# Altium footprint library ParsaLibrary.PcbLib: 526 footprints (part 33 of 33)
Each footprint in its own frame and in the unit in brackets; x right, y up, seen from the top. Pads: shape width x height; smd on the part's side, far side on the other; paste and mask are expansions set on the pad; w line width, h text height; cw(c..) or ccw(c..) is an arc to the next point about the centre after c.
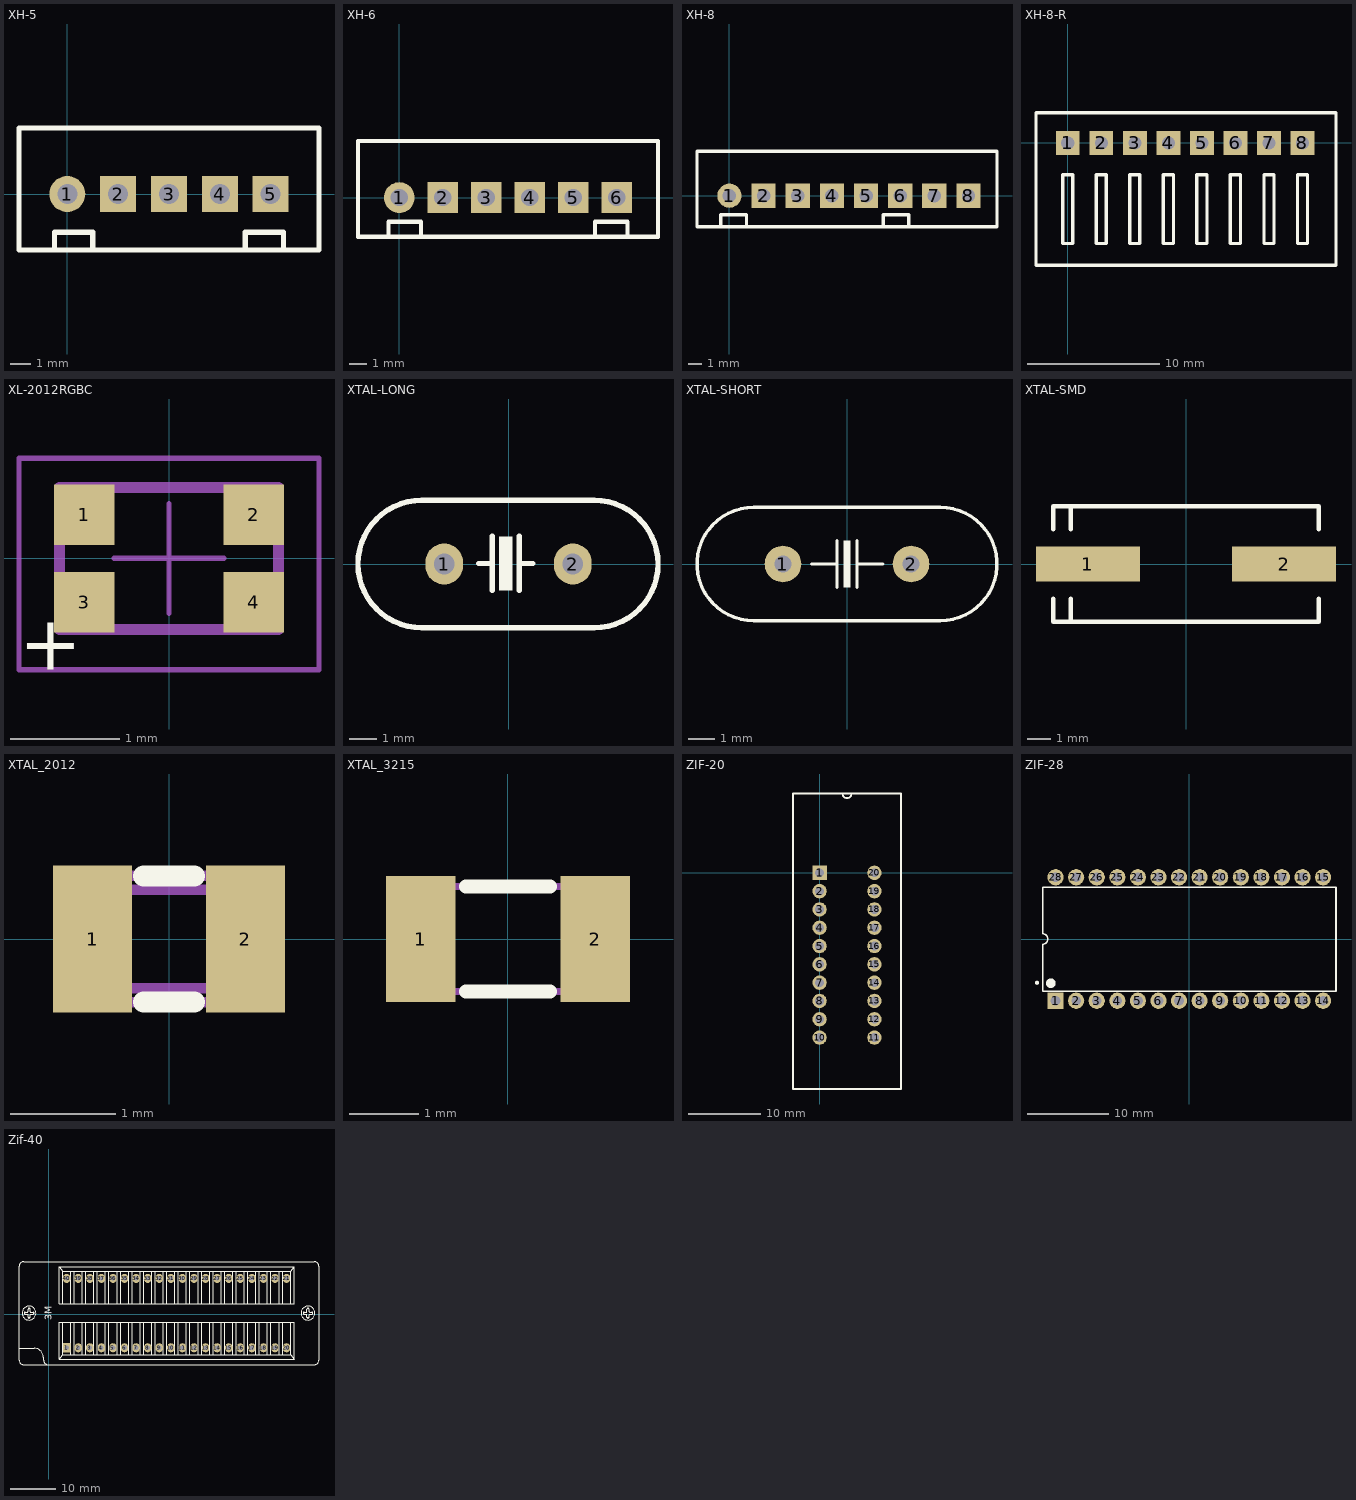
[diagram p32: the footprints below, top view; thin cyan lines are the x and y axes]

## XH-5 [mm]
pads (5):
  round 1.8 hole 1: 1(0,0)
  rect 1.8x1.8 hole 1: 2(2.54,0) 3(5.08,0) 4(7.62,0) 5(10.16,0)
Top Overlay:
  lines w0.254: -0.635,-2.794 -0.635,-1.905 1.27,-1.905 1.27,-2.794 ; 8.89,-2.794 8.89,-1.905 10.795,-1.905 10.795,-2.794 ; -2.413,-2.794 12.573,-2.794 12.573,3.302 -2.413,3.302 -2.413,-2.794
3D body "User Library-XH-A-1 (1).step": height 7, standoff -3.4, extent -2.37,-2.798 12.53,3.302

## XH-6 [mm]
pads (6):
  round 1.8 hole 1: 1(0,0)
  rect 1.8x1.8 hole 1: 2(2.54,0) 3(5.08,0) 4(7.62,0) 5(10.16,0) 6(12.7,0)
Top Overlay:
  lines w0.254: -2.413,-2.3 -2.413,3.302 15.1,3.302 ; -2.413,-2.294 15.1,-2.294 ; -0.635,-2.294 -0.635,-1.405 1.27,-1.405 1.27,-2.294 ; 11.43,-2.294 11.43,-1.405 13.335,-1.405 13.335,-2.294 ; 15.113,-2.3 15.113,3.302
3D body "User Library-PW10-XX-M white.step": height 7, standoff -3.3, extent -2.45,-2.3 15.05,3.4

## XH-8 [mm]
pads (8):
  round 1.8 hole 1: 1(0,0)
  rect 1.8x1.8 hole 1: 2(2.54,0) 3(5.08,0) 4(7.62,0) 5(10.16,0) 6(12.7,0) 7(15.24,0) 8(17.78,0)
Top Overlay:
  lines w0.254: -2.413,-2.3 -2.413,3.302 19.9,3.302 19.9,-2.294 -2.413,-2.294 ; -0.635,-2.294 -0.635,-1.405 1.27,-1.405 1.27,-2.294 ; 11.43,-2.294 11.43,-1.405 13.335,-1.405 13.335,-2.294
3D body "User Library-PW10-XX-M white.step": height 7, standoff -3.3, extent -2.45,-2.3 15.05,3.4

## XH-8-R [mm]
pads (8):
  rect 1.8x1.8 hole 1: 1(0,0) 2(2.54,0) 3(5.08,0) 4(7.62,0) 5(10.16,0) 6(12.7,0) 7(15.24,0) 8(17.78,0)
Top Overlay:
  lines w0.254: 7.239,-7.62 7.239,-2.413 ; 7.239,-7.62 8.001,-7.62 ; 7.239,-7.62 8.001,-7.62 ; 7.239,-7.62 7.239,-2.413 ; 7.239,-2.413 8.001,-2.413 ; 7.239,-2.413 8.001,-2.413 ; 8.001,-7.62 8.001,-2.413 ; 8.001,-7.62 8.001,-2.413 ; 14.859,-7.62 14.859,-2.413 ; 14.859,-7.62 15.621,-7.62 ; 14.859,-7.62 15.621,-7.62 ; 14.859,-7.62 14.859,-2.413 ; 14.859,-2.413 15.621,-2.413 ; 14.859,-2.413 15.621,-2.413 ; 15.621,-7.62 15.621,-2.413 ; 15.621,-7.62 15.621,-2.413 ; -2.413,-9.271 -2.413,2.286 20.32,2.286 20.32,-9.271 -2.413,-9.271 ; -0.381,-7.62 -0.381,-2.413 0.381,-2.413 0.381,-7.62 -0.381,-7.62 ; 2.159,-7.62 2.921,-7.62 2.921,-2.413 2.159,-2.413 2.159,-7.62 ; 4.699,-7.62 5.461,-7.62 5.461,-2.413 4.699,-2.413 4.699,-7.62 ; 9.779,-7.62 10.541,-7.62 10.541,-2.413 9.779,-2.413 9.779,-7.62 ; 12.319,-7.62 13.081,-7.62 13.081,-2.413 12.319,-2.413 12.319,-7.62 ; 17.399,-7.62 18.161,-7.62 18.161,-2.413 17.399,-2.413 17.399,-7.62

## XL-2012RGBC [mm]
pads (4):
  rect 0.55x0.55 smd: 1(-0.775,0.4) 2(0.775,0.4) 3(-0.775,-0.4) 4(0.775,-0.4)
Top Overlay:
  text "+" at -1.372,-1.016 h0.5
Top Courtyard:
  lines w0.05: -0.5,0 0.5,0 ; 0,-0.5 0,0.5 ; -1.372,-1.016 1.372,-1.016 1.372,0.914 -1.372,0.914 -1.372,-1.016
Bottom Component Outline:
  lines w0.1: -1,-0.65 -1,0.65 1,0.65 1,-0.65 -1,-0.65
3D body "150080M153000.stp": height 0.5, standoff 0, extent -1,-0.65 1,0.65

## XTAL-LONG [mil]
pads (2):
  oval 55x60 hole 30: 1(-93.7,0) 2(93.7,0)
Top Overlay:
  rectangle: -14.17,-38.58 5.51,40.16
  lines w7.87: -43.7,0.79 -24.02,0.79 ; -24.02,-38.58 -24.02,40.16 ; 15.35,-38.58 15.35,40.16 ; 15.35,0.79 35.04,0.79 ; -126.38,-92.91 cw(c-126.38,0) -126.38,92.91 124.8,92.91 cw(c124.8,0) 124.8,-92.91 -126.38,-92.91
3D body "Part5.STEP": height 514.25, standoff -94.02, extent -224.41,-93.7 222.44,95.28

## XTAL-SHORT [mil]
pads (2):
  round 55 hole 25: 1(-96.06,0) 2(96.06,0)
Top Overlay:
  rectangle: -5,-35 5,35
  lines w5: -53,0 -15,0 ; -15,-35 -15,35 ; 15,-35 15,35 ; 15,0 54,0 ; -140,-85 cw(c-140,0) -140,85 140,85 cw(c140,0) 140,-85 -140,-85
3D body "Crystal-3.8mm.STEP": height 140.16, standoff -78.74, extent -226.38,-88.58 226.38,88.58

## XTAL-SMD [mm]
pads (2):
  rect 4.5x1.5 smd: 1(-4.25,0) 2(4.25,0)
Top Overlay:
  lines w0.2: -5.75,-1.5 -5.75,-2.5 5.75,-2.5 5.75,-1.5 ; -5.75,1.5 -5.75,2.5 5.75,2.5 5.75,1.5 ; -5,-2.5 -5,-1.5 ; -5,1.5 -5,2.5
3D body "User Library-HC49_SMD.STEP": height 5.18, standoff 0, extent -6.209,-2.25 6.091,2.25

## XTAL_2012 [mm]
pads (2):
  rect 0.75x1.4 smd: 1(-0.725,0) 2(0.725,0)
Top Overlay:
  lines w0.2: -0.24,-0.6 0.24,-0.6 ; -0.24,0.6 0.24,0.6
Mechanical 7:
  lines w0.1: -1,-0.5 cw(c-1,-0.6) -0.9,-0.6 0.9,-0.6 cw(c1,-0.6) 1,-0.5 1,0.5 cw(c1,0.6) 0.9,0.6 -0.9,0.6 cw(c-1,0.6) -1,0.5 -1,-0.5 ; -0.87,-0.37 ccw(c-0.77,-0.37) -0.77,-0.47 0.77,-0.47 ccw(c0.77,-0.37) 0.87,-0.37 0.87,0.37 ccw(c0.77,0.37) 0.77,0.47 -0.77,0.47 ccw(c-0.77,0.37) -0.87,0.37 -0.87,-0.37
  text ".Designator" at -0.7,-0.2 h0.38
3D body "User Library-ABS06.STEP": height 0.6, standoff 0, extent -1,-0.61 1,0.61
3D body: height 0.6, standoff 0.15, extent -0.825,-0.4 0.825,0.4

## XTAL_3215 [mm]
pads (2):
  rect 1x1.8 smd: 1(-1.25,0) 2(1.25,0)
Top Overlay:
  lines w0.2: -0.6,-0.75 0.6,-0.75 ; -0.6,0.75 0.6,0.75
Mechanical 7:
  lines w0.1: -1.6,-0.75 1.6,-0.75 1.6,0.75 -1.6,0.75 -1.6,-0.75
  text ".Designator" at -0.845,-0.133 h0.38
Mechanical 15:
  lines w0.1: -1.6,-0.55 cw(c-1.6,-0.75) -1.4,-0.75 1.4,-0.75 cw(c1.6,-0.75) 1.6,-0.55 1.6,0.55 cw(c1.6,0.75) 1.4,0.75 -1.4,0.75 cw(c-1.6,0.75) -1.6,0.55 -1.6,-0.55
3D body "User Library-Siward_SX3215.step": height 0.81, standoff 0, extent -1.6,-0.75 1.6,0.75
3D body: height 0.81, standoff 0.15, extent -1.2,-0.6 1.2,0.6

## ZAG12 [mm]

## ZIF-20 [mm]
pads (20):
  rect 2x2 hole 1.2: 1(0,0)
  round 2 hole 1.2: 2(0,-2.54) 3(0,-5.08) 4(0,-7.62) 5(0,-10.16) 6(0,-12.7) 7(0,-15.24) 8(0,-17.78) 9(0,-20.32) 10(0,-22.86) 11(7.62,-22.86) 12(7.62,-20.32) 13(7.62,-17.78) 14(7.62,-15.24) 15(7.62,-12.7) 16(7.62,-10.16) 17(7.62,-7.62) 18(7.62,-5.08) 19(7.62,-2.54) 20(7.62,0)
Top Overlay:
  lines w0.254: 3.175,11 ccw(c3.81,11) 4.445,11 ; -3.69,-30 -3.69,11 11.31,11 11.31,-30 -3.69,-30

## ZIF-28 [mm]
pads (28):
  rect 2x2 hole 1.2: 1(-16.51,-7.62)
  round 2 hole 1.2: 2(-13.97,-7.62) 3(-11.43,-7.62) 4(-8.89,-7.62) 5(-6.35,-7.62) 6(-3.81,-7.62) 7(-1.27,-7.62) 8(1.27,-7.62) 9(3.81,-7.62) 10(6.35,-7.62) 11(8.89,-7.62) 12(11.43,-7.62) 13(13.97,-7.62) 14(16.51,-7.62) 15(16.51,7.62) 16(13.97,7.62) 17(11.43,7.62) 18(8.89,7.62) 19(6.35,7.62) 20(3.81,7.62) 21(1.27,7.62) 22(-1.27,7.62) 23(-3.81,7.62) 24(-6.35,7.62) 25(-8.89,7.62) 26(-11.43,7.62) 27(-13.97,7.62) 28(-16.51,7.62)
Top Overlay:
  circle w0.25: c-18.8,-5.4 r0.125
  circle w0.6: c-17.1,-5.46 r0.3
  lines w0.2: -18.1,-0.7 -18.1,-6.46 18.1,-6.46 18.1,6.38 -18.1,6.38 -18.1,0.7 ; -18.1,-0.635 ccw(c-18.1,0) -18.1,0.635
3D body "textool.stp": height 19.87, standoff -4.34, extent -20.05,-10.6 20.45,9.86

## Zif-40 [mm]
pads (40):
  rect 1.6x2 hole 1: 1(3.937,-7.366)
  oval 1.6x2 hole 1: 2(6.477,-7.366) 3(9.017,-7.366) 4(11.557,-7.366) 5(14.097,-7.366) 6(16.637,-7.366) 7(19.177,-7.366) 8(21.717,-7.366) 9(24.257,-7.366) 10(26.797,-7.366) 11(29.337,-7.366) 12(31.877,-7.366) 13(34.417,-7.366) 14(36.957,-7.366) 15(39.497,-7.366) 16(42.037,-7.366) 17(44.577,-7.366) 18(47.117,-7.366) 19(49.657,-7.366) 20(52.197,-7.366) 21(52.197,7.874) 22(49.657,7.874) 23(47.117,7.874) 24(44.577,7.874) 25(42.037,7.874) 26(39.497,7.874) 27(36.957,7.874) 28(34.417,7.874) 29(31.877,7.874) 30(29.337,7.874) 31(26.797,7.874) 32(24.257,7.874) 33(21.717,7.874) 34(19.177,7.874) 35(16.637,7.874) 36(14.097,7.874) 37(11.557,7.874) 38(9.017,7.874) 39(6.477,7.874) 40(3.937,7.874)
Top Overlay:
  circle w0.076: c56.896,0.254 r1.524
  circle w0.076: c-4.318,0.254 r1.524
  lines w0.076: -5.156,0 -4.623,0 cw(c-4.623,-0.051) -4.572,-0.051 ; -5.156,0.025 cw(c-5.156,0.254) -5.385,0.254 cw(c-5.156,0.254) -5.156,0.483 -4.623,0.483 ccw(c-4.623,0.533) -4.572,0.533 ; -4.547,-0.051 -4.547,-0.61 ccw(c-4.318,-0.61) -4.318,-0.838 ccw(c-4.318,-0.61) -4.089,-0.61 -4.089,-0.076 ; -4.547,0.559 -4.547,1.092 cw(c-4.318,1.092) -4.318,1.321 cw(c-4.318,1.092) -4.089,1.092 -4.089,0.533 ; -4.064,-0.051 cw(c-4.013,-0.051) -4.013,0 -3.454,0 ; -4.064,0.533 ccw(c-4.013,0.533) -4.013,0.483 -3.454,0.483 cw(c-3.454,0.254) -3.226,0.254 cw(c-3.454,0.254) -3.454,0.025 ; 3.048,-1.778 3.048,-8.89 ; 3.048,2.286 3.048,9.398 ; 4.826,-8.89 4.826,-1.778 ; 4.826,2.286 4.826,9.398 ; 5.588,-8.89 5.588,-1.778 ; 5.588,2.286 5.588,9.398 ; 7.366,-8.89 7.366,-1.778 ; 7.366,2.286 7.366,9.398 ; 8.128,-8.89 8.128,-1.778 ; 8.128,2.286 8.128,9.398 ; 9.906,-8.89 9.906,-1.778 ; 9.906,2.286 9.906,9.398 ; 10.668,-8.89 10.668,-1.778 ; 10.668,2.286 10.668,9.398 ; 12.446,-8.89 12.446,-1.778 ; 12.446,2.286 12.446,9.398 ; 13.208,-8.89 13.208,-1.778 ; 13.208,2.286 13.208,9.398 ; 14.986,-8.89 14.986,-1.778 ; 14.986,2.286 14.986,9.398 ; 15.748,-8.89 15.748,-1.778 ; 15.748,2.286 15.748,9.398 ; 17.526,-8.89 17.526,-1.778 ; 17.526,2.286 17.526,9.398 ; 18.288,-8.89 18.288,-1.778 ; 18.288,2.286 18.288,9.398 ; 20.066,-8.89 20.066,-1.778 ; 20.066,2.286 20.066,9.398 ; 20.828,-8.89 20.828,-1.778 ; 20.828,2.286 20.828,9.398 ; 22.606,-8.89 22.606,-1.778 ; 22.606,2.286 22.606,9.398 ; 23.368,-8.89 23.368,-1.778 ; 23.368,2.286 23.368,9.398 ; 25.146,-8.89 25.146,-1.778 ; 25.146,2.286 25.146,9.398 ; 25.908,-8.89 25.908,-1.778 ; 25.908,2.286 25.908,9.398 ; 27.686,-8.89 27.686,-1.778 ; 27.686,2.286 27.686,9.398 ; 28.448,-8.89 28.448,-1.778 ; 28.448,2.286 28.448,9.398 ; 30.226,-8.89 30.226,-1.778 ; 30.226,2.286 30.226,9.398 ; 30.988,-8.89 30.988,-1.778 ; 30.988,2.286 30.988,9.398 ; 32.766,-8.89 32.766,-1.778 ; 32.766,2.286 32.766,9.398 ; 33.528,-8.89 33.528,-1.778 ; 33.528,2.286 33.528,9.398 ; 35.306,-8.89 35.306,-1.778 ; 35.306,2.286 35.306,9.398 ; 36.068,-8.89 36.068,-1.778 ; 36.068,2.286 36.068,9.398 ; 37.846,-8.89 37.846,-1.778 ; 37.846,2.286 37.846,9.398 ; 38.608,-8.89 38.608,-1.778 ; 38.608,2.286 38.608,9.398 ; 40.386,-8.89 40.386,-1.778 ; 40.386,2.286 40.386,9.398 ; 41.148,-8.89 41.148,-1.778 ; 41.148,2.286 41.148,9.398 ; 42.926,-8.89 42.926,-1.778 ; 42.926,2.286 42.926,9.398 ; 43.688,-8.89 43.688,-1.778 ; 43.688,2.286 43.688,9.398 ; 45.466,-8.89 45.466,-1.778 ; 45.466,2.286 45.466,9.398 ; 46.228,-8.89 46.228,-1.778 ; 46.228,2.286 46.228,9.398 ; 48.006,-8.89 48.006,-1.778 ; 48.006,2.286 48.006,9.398 ; 48.768,-8.89 48.768,-1.778 ; 48.768,2.286 48.768,9.398 ; 50.546,-8.89 50.546,-1.778 ; 50.546,2.286 50.546,9.398 ; 51.308,-8.89 51.308,-1.778 ; 51.308,2.286 51.308,9.398 ; 53.086,-1.778 53.086,-8.89 ; 53.086,2.286 53.086,9.398 ; 56.058,0 56.591,0 cw(c56.591,-0.051) 56.642,-0.051 ; 56.058,0.025 cw(c56.058,0.254) 55.829,0.254 cw(c56.058,0.254) 56.058,0.483 56.617,0.483 ccw(c56.617,0.533) 56.667,0.533 ; 56.667,-0.051 56.667,-0.61 ccw(c56.896,-0.61) 56.896,-0.838 ccw(c56.896,-0.61) 57.125,-0.61 57.125,-0.076 ; 56.667,0.559 56.667,1.092 cw(c56.896,1.092) 56.896,1.321 cw(c56.896,1.092) 57.125,1.092 57.125,0.533 ; 57.15,-0.051 cw(c57.201,-0.051) 57.201,0 57.76,0 ; 57.15,0.533 ccw(c57.201,0.533) 57.201,0.483 ; 57.226,0.483 57.76,0.483 cw(c57.76,0.254) 57.988,0.254 cw(c57.76,0.254) 57.76,0.025 ; 2.286,-9.906 3.048,-8.89 ; 2.286,-9.906 2.286,-1.778 53.848,-1.778 53.848,-9.906 ; 2.286,-9.906 53.848,-9.906 ; 2.286,10.414 3.048,9.398 ; 2.286,10.414 53.848,10.414 ; 2.286,10.414 2.286,2.286 53.848,2.286 53.848,10.414 ; 3.048,-8.89 53.086,-8.89 ; 3.048,9.398 53.086,9.398 ; 53.086,-8.89 53.848,-9.906 ; 53.086,9.398 53.848,10.414
  lines w0.178: -6.528,-10.058 -6.528,10.541 ; -6.502,-10.058 ccw(c-5.512,-10.058) -5.512,-11.049 ; -6.502,10.541 cw(c-5.512,10.541) -5.512,11.532 ; -6.401,-7.468 -3.15,-7.468 ; -5.512,-11.074 58.293,-11.074 ; -5.512,11.557 58.293,11.557 ; -3.15,-7.493 cw(c-3.15,-9.474) -1.169,-9.424 ; -1.143,-9.423 -1.143,-10.058 ccw(c-0.152,-10.058) -0.104,-11.048 ; 58.293,-11.049 ccw(c58.293,-10.058) 59.284,-10.058 ; 58.293,11.532 cw(c58.293,10.541) 59.284,10.541 ; 59.309,-10.058 59.309,10.541
  text "3M" at 0.635,-1.27 h1.52
3D body "User Library-Zif-Zip Socket.STEP": height 21.87, standoff -2.63, extent -13.686,-12.638 59.4,11.838